# Altium footprint library DPIAT_202303.PcbLib: 77 footprints (part 1 of 5)
Each footprint in its own frame and in the unit in brackets; x right, y up, seen from the top. Pads: shape width x height; smd on the part's side, far side on the other; paste and mask are expansions set on the pad; w line width, h text height; cw(c..) or ccw(c..) is an arc to the next point about the centre after c.
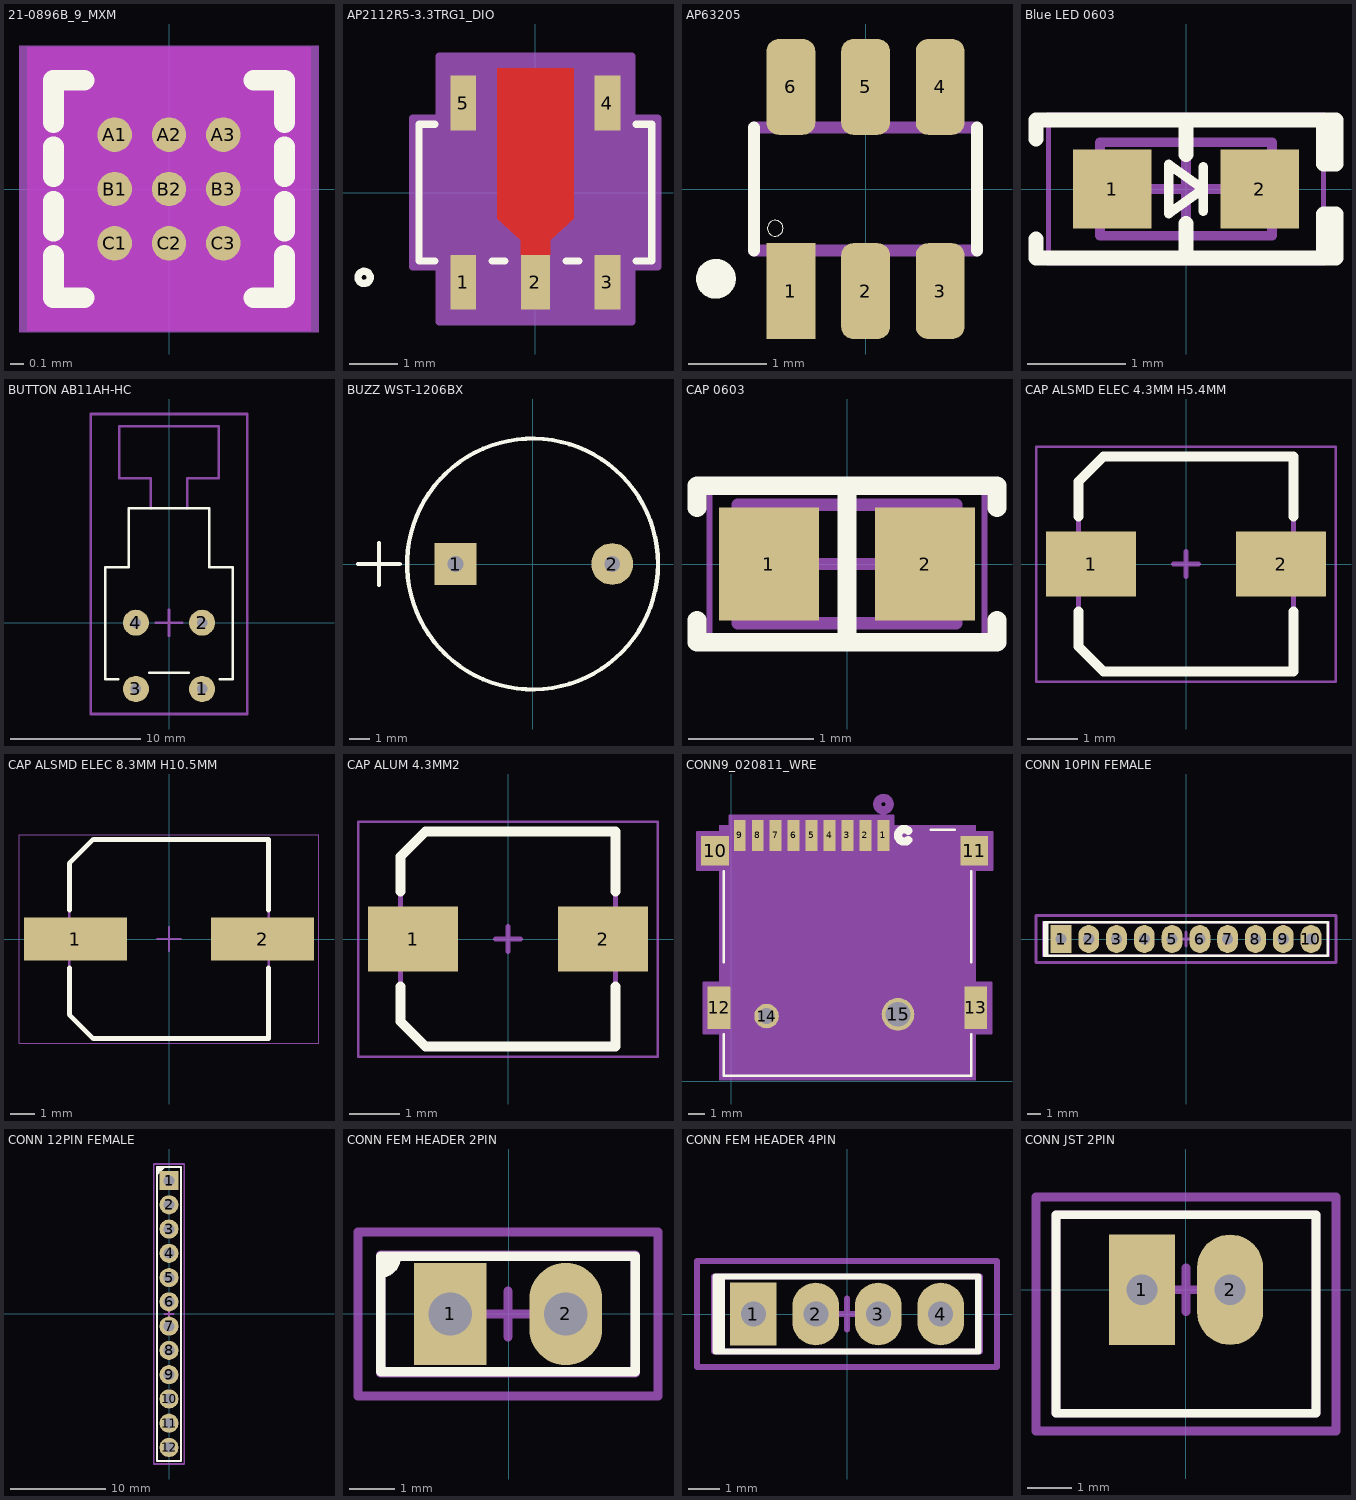
[diagram p0: the footprints below, top view; thin cyan lines are the x and y axes]

## 21-0896B_9_MXM [mil]
pads (9):
  round 10 smd paste+0 mask+0: A1(-15.75,15.75) A2(0,15.75) A3(15.75,15.75) B1(-15.75,0) B2(0,0) B3(15.75,0) C1(-15.75,-15.75) C2(0,-15.75) C3(15.75,-15.75)
Top Overlay:
  lines w6: -33.5,-19.28 -33.5,-31.5 -24.66,-31.5 ; -33.5,-12.22 -33.5,-3.53 ; -33.5,3.53 -33.5,12.22 ; -33.5,19.28 -33.5,31.5 -24.66,31.5 ; 24.66,-31.5 33.5,-31.5 33.5,-19.28 ; 24.66,31.5 33.5,31.5 33.5,19.28 ; 33.5,-12.22 33.5,-3.53 ; 33.5,3.53 33.5,12.22
Keep-Out Layer:
  region: -41.12,-41.12 -41.12,41.12 41.12,41.12 41.12,-41.12
Mechanical 5:
  region: 43.5,-41.5 -43.5,-41.5 -43.5,41.5 43.5,41.5
Mechanical 13:
  lines w1: -28.5,18.63 -20.63,26.5 ; -28.5,-26.5 -28.5,26.5 28.5,26.5 28.5,-26.5 -28.5,-26.5
Mechanical 15:
  region: 38.5,-36.5 -38.5,-36.5 -38.5,36.5 38.5,36.5
  lines w6: -38.5,-36.5 38.5,-36.5 38.5,36.5 -38.5,36.5 -38.5,-36.5
3D body "21-0896B_9_MXM.step": height 27.28, standoff -0.02, extent -28.5,-26.5 28.5,26.5

## AP2112R5-3.3TRG1_DIO [mil]
pads (5):
  rect 21x45 smd paste+0 mask+0: 1(-59.06,-73.5) 3(59.06,-73.5) 4(59.06,73.5) 5(-59.06,73.5)
  rect 24x45 smd paste+0 mask+0: 2(0,-73.5)
Top Layer:
  region: 12,-51 -12,-51 -12,-39 -31.5,-21.5 -31.5,102 -10.5,102 10.5,102 31.5,102 31.5,-21.5 12,-39
Top Overlay:
  circle w6: c-140.5,-69.5 r5
  lines w6: -82.66,-56 -95.5,-56 -95.5,56 -82.66,56 ; -35.46,-56 -25.1,-56 ; 25.1,-56 35.46,-56 ; 82.66,-56 95.5,-56 95.5,56 82.66,56
Top Paste:
  region: 12,-51 -12,-51 -12,-39 -31.5,-21.5 -31.5,102 -10.5,102 10.5,102 31.5,102 31.5,-21.5 12,-39
Top Solder:
  region: 12,-51 -12,-51 -12,-39 -31.5,-21.5 -31.5,102 -10.5,102 10.5,102 31.5,102 31.5,-21.5 12,-39
Mechanical 13:
  circle w0: c-80.5,-41 r5
  lines w1: -90.5,-51 -90.5,51 90.5,51 90.5,-51 -90.5,-51 ; -69.56,-88 -48.56,-88 -48.56,-51 -69.56,-51 -69.56,-88 ; -69.56,51 -69.56,88 -48.56,88 -48.56,51 -69.56,51 ; -12,-88 12,-88 12,-51 -12,-51 -12,-88 ; 48.56,-88 69.56,-88 69.56,-51 48.56,-51 48.56,-88 ; 48.56,51 48.56,88 69.56,88 69.56,51 48.56,51
Mechanical 15:
  region: -100.5,-61 -100.5,61 -79.06,61 -79.06,112 79.06,112 79.06,61 100.5,61 100.5,-61 79.06,-61 79.06,-106 -79.06,-106 -79.06,-61
  lines w6: -100.5,-61 -79.06,-61 -79.06,-106 79.06,-106 79.06,-61 100.5,-61 100.5,61 79.06,61 79.06,112 -79.06,112 -79.06,61 -100.5,61 -100.5,-61
3D body "AP2112R5-33TRG1_DIO.step": height 65.12, standoff 0, extent -90.51,-87.99 90.51,87.99

## AP63205 [mm] "Boost up BUCK"
pads (6):
  rect 0.62x1.22 smd: 1(-0.95,-1.3)
  rrect50% 0.62x1.22 smd: 2(0,-1.3) 3(0.95,-1.3) 4(0.95,1.3) 5(0,1.3) 6(-0.95,1.3)
Top Overlay:
  circle w0: c-1.15,-0.5 r0.1
  circle w0.254: c-1.905,-1.143 r0.127
  lines w0.152: -1.423,-0.781 -1.423,0.781 ; 1.422,-0.781 1.422,0.781
Mechanical 13:
  region: -0.725,0.8 -1.175,0.8 -1.175,1.4 -0.725,1.4
  region: 0.225,0.8 -0.225,0.8 -0.225,1.4 0.225,1.4
  region: 1.175,0.8 0.725,0.8 0.725,1.4 1.175,1.4
  region: 1.175,-1.4 0.725,-1.4 0.725,-0.8 1.175,-0.8
  region: 0.225,-1.4 -0.225,-1.4 -0.225,-0.8 0.225,-0.8
  region: -0.725,-1.4 -1.175,-1.4 -1.175,-0.8 -0.725,-0.8
  lines w0.152: -1.423,-0.781 1.422,-0.781 ; -1.423,0.781 1.422,0.781
3D body "SOIC_05WU-7_DIO.step": height 0.99, standoff 0, extent -1.499,-1.397 1.499,1.397

## Blue LED 0603 [mm] "Blue LED"
pads (2):
  rect 0.8x0.8 smd: 1(-0.75,0) 2(0.75,0)
Top Overlay:
  lines w0.1: 0.175,-0.225 0.175,0 ; 0.175,0.225 0.175,0 ; 0.175,0 -0.175,-0.25 -0.175,0 -0.175,0.25 0.175,0
  lines w0.15: -1.524,-0.508 -1.524,-0.7 1.5,-0.7 ; -1.524,0.508 -1.524,0.7 1.5,0.7 ; 0,-0.7 0,-0.35 ; 0,0.35 0,0.7 ; 1.397,-0.7 1.397,-0.254 1.524,-0.254 1.524,-0.7 1.397,-0.7 ; 1.397,0.254 1.397,0.7 1.524,0.7 1.524,0.254 1.397,0.254
Mechanical 13:
  lines w0.1: -0.875,-0.475 0.875,-0.475 0.875,0.475 -0.875,0.475 -0.875,-0.475
Mechanical 15:
  lines w0.05: -1.397,-0.75 1.397,-0.75 1.397,0.75 -1.397,0.75 -1.397,-0.75
  lines w0.1: -0.475,0 0.475,0 ; 0,-0.475 0,0.475
3D body "LED 0603 Base BLUE.STEP": height 0.28, standoff 0, extent -0.8,-0.4 0.8,0.4
3D body "LED 0603 Lens BLUE.STEP": height 0.53, standoff 0.18, extent -0.55,-0.4 0.55,0.4

## BUTTON AB11AH-HC [mm] "HEAVY BUTTON RED"
pads (4):
  round 2 hole 0.8: 1(2.54,-5.08) 2(2.54,0) 3(-2.54,-5.08) 4(-2.54,0)
Top Overlay:
  lines w0.2: -3.9,-4.34 -4.9,-4.34 -4.9,4.26 -3.1,4.26 -3.1,8.76 3.1,8.76 3.1,4.26 4.9,4.26 4.9,-4.34 3.9,-4.34 ; -1.5,-3.84 1.5,-3.84
Mechanical 1:
  lines w0.2: -1.4,8.76 -1.4,11.06 -3.8,11.06 -3.8,15.06 3.8,15.06 3.8,11.06 1.4,11.06 1.4,8.76
Mechanical 15:
  lines w0.2: -1,0 1,0 ; 0,-1 0,1 ; -6,-7 6,-7 6,16 -6,16 -6,-7
3D body "NKK AB11AH-HC.STEP": height 7.06, standoff -3.1, extent -4.902,-5.39 4.902,15.082

## BUZZ WST-1206BX [mm] "Buss WST 1206BX"
pads (2):
  rect 2x2 hole 0.75: 1(-3.683,0)
  round 2 hole 0.75: 2(3.81,0)
Top Overlay:
  circle w0.2: c0,0 r6
  lines w0.2: -8.349,0 -6.349,0 ; -7.349,-1 -7.349,1
3D body "KXG1203A--3DModel-STEP-532303.STEP": height 9.5, standoff -3.5, extent -6,-6 6,6

## CAP 0603 [mm] "Cap ceramique 0603"
pads (2):
  rect 0.8x0.9 smd: 1(-0.625,0) 2(0.625,0)
Top Overlay:
  lines w0.15: -1.2,-0.45 -1.2,-0.625 1.2,-0.625 1.2,-0.45 ; -1.2,0.45 -1.2,0.625 1.2,0.625 1.2,0.45 ; 0,-0.625 0,0.625
Mechanical 13:
  lines w0.1: -0.875,-0.475 -0.875,0.475 0.875,0.475 0.875,-0.475 -0.875,-0.475
Mechanical 15:
  lines w0.05: -1.1,-0.6 -1.1,0.6 1.1,0.6 1.1,-0.6 -1.1,-0.6
  lines w0.1: -0.475,0 0.475,0 ; 0,-0.475 0,0.475
3D body "0603 cap.STEP": height 0.82, standoff 0, extent -0.8,-0.412 0.8,0.412

## CAP ALSMD ELEC 4.3MM H5.4MM [mm] "Aluminum SMD Electrolytic Capacitor, 4.30mm Land Size, 4.00mm Diameter, 5.40mm Height, 4.60mm Maximum Leads Span"
height 0.65
pads (2):
  rect 1.8x1.3 smd: 1(-1.9,0) 2(1.9,0)
Top Overlay:
  lines w0.2: -2.15,-0.95 -2.15,-1.65 -1.65,-2.15 2.15,-2.15 2.15,-0.95 ; -2.15,0.95 -2.15,1.65 -1.65,2.15 2.15,2.15 2.15,0.95
Mechanical 13:
  lines w0.1: -2.15,-1.65 -2.15,1.65 -1.65,2.15 2.15,2.15 2.15,-2.15 -1.65,-2.15 -2.15,-1.65
Mechanical 15:
  lines w0.05: -3,-2.35 -3,2.35 3,2.35 3,-2.35 -3,-2.35
  lines w0.1: -0.25,0 0.25,0 ; 0,-0.25 0,0.25
3D body ".STEP": height 5.4, standoff 0, extent -2.3,-2.15 2.3,2.15

## CAP ALSMD ELEC 8.3MM H10.5MM [mm] "Aluminum SMD Electrolytic Capacitor, 8.30mm Land Size, 8.00mm Diameter, 10.50mm Height, 10.00mm Maximum Leads Span"
height 0.9
pads (2):
  rect 4.3x1.8 smd: 1(-3.9,0) 2(3.9,0)
Top Overlay:
  lines w0.2: -4.15,-1.2 -4.15,-3.15 -3.15,-4.15 4.15,-4.15 4.15,-1.2 ; -4.15,1.2 -4.15,3.15 -3.15,4.15 4.15,4.15 4.15,1.2
Mechanical 13:
  lines w0.1: -4.15,-3.15 -3.15,-4.15 4.15,-4.15 4.15,4.15 -3.15,4.15 -4.15,3.15 -4.15,-3.15
Mechanical 15:
  lines w0.05: -6.25,-4.35 6.25,-4.35 6.25,4.35 -6.25,4.35 -6.25,-4.35
  lines w0.1: -0.5,0 0.5,0 ; 0,-0.5 0,0.5
3D body ".STEP": height 10.5, standoff 0, extent -5,-4.15 5,4.15

## CAP ALUM 4.3MM2 [mm]
pads (2):
  rect 1.8x1.3 smd: 1(-1.9,0) 2(1.9,0)
Top Overlay:
  lines w0.2: -2.15,-0.95 -2.15,-1.65 -1.65,-2.15 2.15,-2.15 2.15,-0.95 ; -2.15,0.95 -2.15,1.65 -1.65,2.15 2.15,2.15 2.15,0.95
Mechanical 13:
  lines w0.1: -2.15,-1.65 -2.15,1.65 -1.65,2.15 2.15,2.15 2.15,-2.15 -1.65,-2.15 -2.15,-1.65
Mechanical 15:
  lines w0.05: -3,-2.35 -3,2.35 3,2.35 3,-2.35 -3,-2.35
  lines w0.1: -0.25,0 0.25,0 ; 0,-0.25 0,0.25
3D body ".STEP": height 5.4, standoff 0, extent -2.3,-2.15 2.3,2.15

## CONN9_020811_WRE [mil]
pads (15):
  rect 28x75 smd paste+0 mask+0: 1(366.54,592.56) 2(323.23,592.56) 3(279.92,592.56) 4(236.61,592.56) 5(193.31,592.56) 6(150,592.56) 7(106.69,592.56) 8(63.39,592.56) 9(20.08,592.56)
  rect 67x71 smd: 10(-38.98,555.08) 11(585.04,555.08)
  rect 55x102 smd: 12(-29.13,177.13) 13(588.98,177.13)
  round 59 hole 39: 14(85.04,157.44)
  round 78.74 hole 59.06: 15(401.57,161.42)
Top Overlay:
  lines w6: -18.58,113.03 -18.58,13.3 578.42,13.3 578.42,113.03 ; -18.58,287.45 -18.58,506.48 ; 480.25,606.3 538.44,606.3 ; 578.42,287.45 578.42,506.48
  lines w20: 426.32,581.19 cw(c416.54,592.56) 426.32,603.93
Bottom Overlay:
  circle w20: c416.54,592.56 r15
Mechanical 5:
  region: -28.58,616.3 588.42,616.3 588.42,3.3 -28.58,3.3
Mechanical 13:
  circle w20: c366.54,667.56 r15
  lines w1: -13.58,18.3 -13.58,601.3 573.42,601.3 573.42,18.3 -13.58,18.3
Mechanical 15:
  region: 583.42,238.13 583.42,509.58 628.54,509.58 628.54,600.58 583.42,600.58 583.42,611.3 390.54,611.3 390.54,640.06 -3.92,640.06 -3.92,611.3 -23.58,611.3 -23.58,600.58 -82.48,600.58 -82.48,509.58 -23.58,509.58 -23.58,238.13 -66.63,238.13 -66.63,116.13 -23.58,116.13 -23.58,8.3 583.42,8.3 583.42,116.13 626.48,116.13 626.48,238.13
  lines w6: -82.48,509.58 -23.58,509.58 -23.58,238.13 -66.63,238.13 -66.63,116.13 -23.58,116.13 -23.58,8.3 583.42,8.3 583.42,116.13 626.48,116.13 626.48,238.13 583.42,238.13 583.42,509.58 628.54,509.58 628.54,600.58 583.42,600.58 583.42,611.3 390.54,611.3 390.54,640.06 -3.92,640.06 -3.92,611.3 -23.58,611.3 -23.58,600.58 -82.48,600.58 -82.48,509.58
3D body: height 10, standoff 0, extent 366.54,592.56 376.54,602.56

## CONN 10PIN FEMALE [mm] "Conn female 12 PIN 0.2mm spacing"
pads (10):
  rect 1.5x2 hole 0.8: 1(-9,0)
  oval 1.5x2 hole 0.8: 2(-7,0) 3(-5,0) 4(-3,0) 5(-1,0) 6(1,0) 7(3,0) 8(5,0) 9(7,0) 10(9,0)
Top Overlay:
  lines w0.2: -10,-1.2 -10,1.2 ; -10.2,-1.2 10.2,-1.2 10.2,1.2 -10.2,1.2 -10.2,-1.2
Mechanical 1:
  lines w0.2: -10.25,-1.2 10.25,-1.2 10.25,1.2 -10.25,1.2 -10.25,-1.2
Mechanical 15:
  lines w0.2: -0.5,0 0.5,0 ; 0,-0.5 0,0.5 ; -10.8,-1.7 -10.8,1.7 10.8,1.7 10.8,-1.7 -10.8,-1.7
3D body "Sullins NPPN101BFCN-RC.STEP": height 4.41, standoff -2.39, extent -10.25,-1.2 10.25,1.2

## CONN 12PIN FEMALE [mm] "12 pin female conn 0.5mm spacing"
pads (12):
  rect 2x2 hole 1.1: 1(0,13.943)
  round 2 hole 1.1: 2(0,11.403) 3(0,8.863) 4(0,6.323) 5(0,3.783) 6(0,1.243) 7(0,-1.297) 8(0,-3.837) 9(0,-6.377) 10(0,-8.917) 11(0,-11.457) 12(0,-13.997)
Top Overlay:
  region: -1.23,15.403 -1.23,14.503 -0.33,15.403
  lines w0.2: -1.27,-15.427 -1.27,15.373 1.27,15.373 1.27,-15.427 -1.27,-15.427
Top Courtyard:
  lines w0.2: -1.6,-15.727 -1.6,15.673 1.6,15.673 1.6,-15.727 -1.6,-15.727
Top Assembly:
  lines w0.2: -0.5,-0.027 0.5,-0.027 ; 0,-0.527 0,0.473 ; -1.27,-15.427 -1.27,15.373 1.27,15.373 1.27,-15.427 -1.27,-15.427
3D body "M20-7821242.step": height 8.5, standoff -3, extent -1.25,-15.467 1.25,15.413

## CONN FEM HEADER 2PIN [mm]
pads (2):
  rect 1.6x2.25 hole 0.95: 1(-1.285,-0.006)
  oval 1.6x2.25 hole 0.95: 2(1.255,-0.006)
Top Overlay:
  region: -2.815,1.264 -2.475,1.264 -2.475,1.094 -2.675,0.894 -2.815,0.894
  lines w0.2: -2.815,0.894 ccw(c-2.815,1.234) -2.475,1.234 -2.475,1.264 ; -2.815,-1.276 2.785,-1.276 2.785,1.264 -2.815,1.264 -2.815,-1.276
Mechanical 13:
  lines w0.2: -2.815,-1.306 -2.815,1.294 2.785,1.294 2.785,-1.306 -2.815,-1.306
Mechanical 15:
  lines w0.2: -0.515,-0.006 0.485,-0.006 ; -0.015,-0.506 -0.015,0.494 ; -3.315,-1.806 3.285,-1.806 3.285,1.794 -3.315,1.794 -3.315,-1.806
3D body "Samtec-SSW-102-03-T-S.STEP": height 8.51, standoff -10.01, extent -2.809,-1.212 2.779,1.201

## CONN FEM HEADER 4PIN [mm]
pads (4):
  rect 1.5x2 hole 0.8: 1(-3,0)
  oval 1.5x2 hole 0.8: 2(-1,0) 3(1,0) 4(3,0)
Top Overlay:
  lines w0.2: -4,-1.2 -4,1.2 ; -4.2,-1.2 4.2,-1.2 4.2,1.2 -4.2,1.2 -4.2,-1.2
Mechanical 1:
  lines w0.2: 4.25,-1.2 4.25,1.2 -4.25,1.2 -4.25,-1.2 4.25,-1.2
Mechanical 15:
  lines w0.2: -0.5,0 0.5,0 ; 0,-0.5 0,0.5 ; -4.8,-1.7 4.8,-1.7 4.8,1.7 -4.8,1.7 -4.8,-1.7
3D body "Sullins NPPN041BFCN-RC.STEP": height 4.41, standoff -2.39, extent -4.25,-1.2 4.25,1.2

## CONN JST 2PIN [mm]
pads (2):
  rect 1.5x2.5 hole 0.7: 1(-1,0)
  oval 1.5x2.5 hole 0.7: 2(1,0)
Top Overlay:
  lines w0.2: -2.95,-2.8 2.95,-2.8 2.95,1.7 -2.95,1.7 -2.95,-2.8
Bottom Overlay:
  circle w0.254: c-2.1,1.1 r0.141
Mechanical 13:
  lines w0.2: -2.95,-2.8 -2.95,1.7 2.95,1.7 2.95,-2.8 -2.95,-2.8
Mechanical 15:
  lines w0.2: -0.5,0 0.5,0 ; 0,-0.5 0,0.5 ; -3.4,-3.2 -3.4,2.1 3.4,2.1 3.4,-3.2 -3.4,-3.2
3D body "JST B2B-PH-K-S.STEP": height 6, standoff -3.4, extent -2.95,-2.8 2.95,1.7